# Altium footprint library Connector_Samtec_HLE_SMD.PcbLib: 290 footprints (part 24 of 24)
Each footprint in its own frame and in the unit in brackets; x right, y up, seen from the top. Pads: shape width x height; smd on the part's side, far side on the other; paste and mask are expansions set on the pad; w line width, h text height; cw(c..) or ccw(c..) is an arc to the next point about the centre after c.
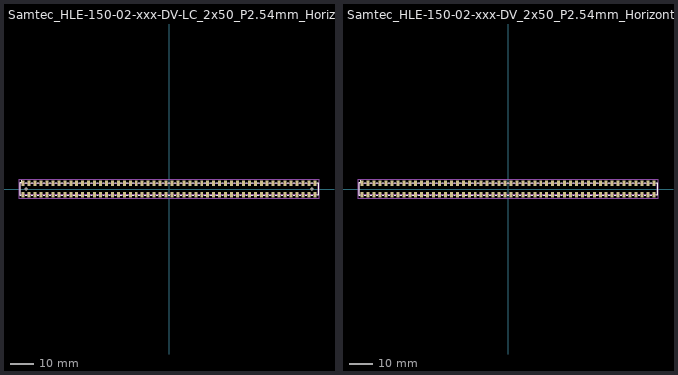
[diagram p23: the footprints below, top view; thin cyan lines are the x and y axes]

## Samtec_HLE-150-02-xxx-DV-LC_2x50_P2.54mm_Horizontal [mm]
pads (102):
  rect 1.27x2.29 smd: 1(-62.23,2.525) 2(-62.23,-2.525) 3(-59.69,2.525) 4(-59.69,-2.525) 5(-57.15,2.525) 6(-57.15,-2.525) 7(-54.61,2.525) 8(-54.61,-2.525) 9(-52.07,2.525) 10(-52.07,-2.525) 11(-49.53,2.525) 12(-49.53,-2.525) 13(-46.99,2.525) 14(-46.99,-2.525) 15(-44.45,2.525) 16(-44.45,-2.525) 17(-41.91,2.525) 18(-41.91,-2.525) 19(-39.37,2.525) 20(-39.37,-2.525) 21(-36.83,2.525) 22(-36.83,-2.525) 23(-34.29,2.525) 24(-34.29,-2.525) 25(-31.75,2.525) 26(-31.75,-2.525) 27(-29.21,2.525) 28(-29.21,-2.525) 29(-26.67,2.525) 30(-26.67,-2.525) 31(-24.13,2.525) 32(-24.13,-2.525) 33(-21.59,2.525) 34(-21.59,-2.525) 35(-19.05,2.525) 36(-19.05,-2.525) 37(-16.51,2.525) 38(-16.51,-2.525) 39(-13.97,2.525) 40(-13.97,-2.525) 41(-11.43,2.525) 42(-11.43,-2.525) 43(-8.89,2.525) 44(-8.89,-2.525) 45(-6.35,2.525) 46(-6.35,-2.525) 47(-3.81,2.525) 48(-3.81,-2.525) 49(-1.27,2.525) 50(-1.27,-2.525) 51(1.27,2.525) 52(1.27,-2.525) 53(3.81,2.525) 54(3.81,-2.525) 55(6.35,2.525) 56(6.35,-2.525) 57(8.89,2.525) 58(8.89,-2.525) 59(11.43,2.525) 60(11.43,-2.525) 61(13.97,2.525) 62(13.97,-2.525) 63(16.51,2.525) 64(16.51,-2.525) 65(19.05,2.525) 66(19.05,-2.525) 67(21.59,2.525) 68(21.59,-2.525) 69(24.13,2.525) 70(24.13,-2.525) 71(26.67,2.525) 72(26.67,-2.525) 73(29.21,2.525) 74(29.21,-2.525) 75(31.75,2.525) 76(31.75,-2.525) 77(34.29,2.525) 78(34.29,-2.525) 79(36.83,2.525) 80(36.83,-2.525) 81(39.37,2.525) 82(39.37,-2.525) 83(41.91,2.525) 84(41.91,-2.525) 85(44.45,2.525) 86(44.45,-2.525) 87(46.99,2.525) 88(46.99,-2.525) 89(49.53,2.525) 90(49.53,-2.525) 91(52.07,2.525) 92(52.07,-2.525) 93(54.61,2.525) 94(54.61,-2.525) 95(57.15,2.525) 96(57.15,-2.525) 97(59.69,2.525) 98(59.69,-2.525) 99(62.23,2.525) 100(62.23,-2.525)
  round 1.19 hole 1.19: Un1(-60.96,0) Un2(60.96,0)
F.SilkS:
  lines w0.12: -63.125,-2.65 -63.61,-2.65 -63.61,2.65 -63.125,2.65 -63.125,3.67 ; -61.335,-2.65 -60.585,-2.65 ; -61.335,2.65 -60.585,2.65 ; -58.795,-2.65 -58.045,-2.65 ; -58.795,2.65 -58.045,2.65 ; -56.255,-2.65 -55.505,-2.65 ; -56.255,2.65 -55.505,2.65 ; -53.715,-2.65 -52.965,-2.65 ; -53.715,2.65 -52.965,2.65 ; -51.175,-2.65 -50.425,-2.65 ; -51.175,2.65 -50.425,2.65 ; -48.635,-2.65 -47.885,-2.65 ; -48.635,2.65 -47.885,2.65 ; -46.095,-2.65 -45.345,-2.65 ; -46.095,2.65 -45.345,2.65 ; -43.555,-2.65 -42.805,-2.65 ; -43.555,2.65 -42.805,2.65 ; -41.015,-2.65 -40.265,-2.65 ; -41.015,2.65 -40.265,2.65 ; -38.475,-2.65 -37.725,-2.65 ; -38.475,2.65 -37.725,2.65 ; -35.935,-2.65 -35.185,-2.65 ; -35.935,2.65 -35.185,2.65 ; -33.395,-2.65 -32.645,-2.65 ; -33.395,2.65 -32.645,2.65 ; -30.855,-2.65 -30.105,-2.65 ; -30.855,2.65 -30.105,2.65 ; -28.315,-2.65 -27.565,-2.65 ; -28.315,2.65 -27.565,2.65 ; -25.775,-2.65 -25.025,-2.65 ; -25.775,2.65 -25.025,2.65 ; -23.235,-2.65 -22.485,-2.65 ; -23.235,2.65 -22.485,2.65 ; -20.695,-2.65 -19.945,-2.65 ; -20.695,2.65 -19.945,2.65 ; -18.155,-2.65 -17.405,-2.65 ; -18.155,2.65 -17.405,2.65 ; -15.615,-2.65 -14.865,-2.65 ; -15.615,2.65 -14.865,2.65 ; -13.075,-2.65 -12.325,-2.65 ; -13.075,2.65 -12.325,2.65 ; -10.535,-2.65 -9.785,-2.65 ; -10.535,2.65 -9.785,2.65 ; -7.995,-2.65 -7.245,-2.65 ; -7.995,2.65 -7.245,2.65 ; -5.455,-2.65 -4.705,-2.65 ; -5.455,2.65 -4.705,2.65 ; -2.915,-2.65 -2.165,-2.65 ; -2.915,2.65 -2.165,2.65 ; -0.375,-2.65 0.375,-2.65 ; -0.375,2.65 0.375,2.65 ; 2.165,-2.65 2.915,-2.65 ; 2.165,2.65 2.915,2.65 ; 4.705,-2.65 5.455,-2.65 ; 4.705,2.65 5.455,2.65 ; 7.245,-2.65 7.995,-2.65 ; 7.245,2.65 7.995,2.65 ; 9.785,-2.65 10.535,-2.65 ; 9.785,2.65 10.535,2.65 ; 12.325,-2.65 13.075,-2.65 ; 12.325,2.65 13.075,2.65 ; 14.865,-2.65 15.615,-2.65 ; 14.865,2.65 15.615,2.65 ; 17.405,-2.65 18.155,-2.65 ; 17.405,2.65 18.155,2.65 ; 19.945,-2.65 20.695,-2.65 ; 19.945,2.65 20.695,2.65 ; 22.485,-2.65 23.235,-2.65 ; 22.485,2.65 23.235,2.65 ; 25.025,-2.65 25.775,-2.65 ; 25.025,2.65 25.775,2.65 ; 27.565,-2.65 28.315,-2.65 ; 27.565,2.65 28.315,2.65 ; 30.105,-2.65 30.855,-2.65 ; 30.105,2.65 30.855,2.65 ; 32.645,-2.65 33.395,-2.65 ; 32.645,2.65 33.395,2.65 ; 35.185,-2.65 35.935,-2.65 ; 35.185,2.65 35.935,2.65 ; 37.725,-2.65 38.475,-2.65 ; 37.725,2.65 38.475,2.65 ; 40.265,-2.65 41.015,-2.65 ; 40.265,2.65 41.015,2.65 ; 42.805,-2.65 43.555,-2.65 ; 42.805,2.65 43.555,2.65 ; 45.345,-2.65 46.095,-2.65 ; 45.345,2.65 46.095,2.65 ; 47.885,-2.65 48.635,-2.65 ; 47.885,2.65 48.635,2.65 ; 50.425,-2.65 51.175,-2.65 ; 50.425,2.65 51.175,2.65 ; 52.965,-2.65 53.715,-2.65 ; 52.965,2.65 53.715,2.65 ; 55.505,-2.65 56.255,-2.65 ; 55.505,2.65 56.255,2.65 ; 58.045,-2.65 58.795,-2.65 ; 58.045,2.65 58.795,2.65 ; 60.585,-2.65 61.335,-2.65 ; 60.585,2.65 61.335,2.65 ; 63.125,-2.65 63.61,-2.65 63.61,2.65 63.125,2.65
F.CrtYd:
  lines w0.05: -64,-4.17 -64,4.17 64,4.17 64,-4.17 -64,-4.17
F.Fab:
  lines w0.1: -62.73,2.54 -62.23,1.833 -61.73,2.54 ; -63.5,-2.54 -63.5,2.54 63.5,2.54 63.5,-2.54 -63.5,-2.54
  text "'.Designator'" at -4.047,-2.68 h1

## Samtec_HLE-150-02-xxx-DV_2x50_P2.54mm_Horizontal [mm]
pads (100):
  rect 1.27x2.29 smd: 1(-62.23,2.525) 2(-62.23,-2.525) 3(-59.69,2.525) 4(-59.69,-2.525) 5(-57.15,2.525) 6(-57.15,-2.525) 7(-54.61,2.525) 8(-54.61,-2.525) 9(-52.07,2.525) 10(-52.07,-2.525) 11(-49.53,2.525) 12(-49.53,-2.525) 13(-46.99,2.525) 14(-46.99,-2.525) 15(-44.45,2.525) 16(-44.45,-2.525) 17(-41.91,2.525) 18(-41.91,-2.525) 19(-39.37,2.525) 20(-39.37,-2.525) 21(-36.83,2.525) 22(-36.83,-2.525) 23(-34.29,2.525) 24(-34.29,-2.525) 25(-31.75,2.525) 26(-31.75,-2.525) 27(-29.21,2.525) 28(-29.21,-2.525) 29(-26.67,2.525) 30(-26.67,-2.525) 31(-24.13,2.525) 32(-24.13,-2.525) 33(-21.59,2.525) 34(-21.59,-2.525) 35(-19.05,2.525) 36(-19.05,-2.525) 37(-16.51,2.525) 38(-16.51,-2.525) 39(-13.97,2.525) 40(-13.97,-2.525) 41(-11.43,2.525) 42(-11.43,-2.525) 43(-8.89,2.525) 44(-8.89,-2.525) 45(-6.35,2.525) 46(-6.35,-2.525) 47(-3.81,2.525) 48(-3.81,-2.525) 49(-1.27,2.525) 50(-1.27,-2.525) 51(1.27,2.525) 52(1.27,-2.525) 53(3.81,2.525) 54(3.81,-2.525) 55(6.35,2.525) 56(6.35,-2.525) 57(8.89,2.525) 58(8.89,-2.525) 59(11.43,2.525) 60(11.43,-2.525) 61(13.97,2.525) 62(13.97,-2.525) 63(16.51,2.525) 64(16.51,-2.525) 65(19.05,2.525) 66(19.05,-2.525) 67(21.59,2.525) 68(21.59,-2.525) 69(24.13,2.525) 70(24.13,-2.525) 71(26.67,2.525) 72(26.67,-2.525) 73(29.21,2.525) 74(29.21,-2.525) 75(31.75,2.525) 76(31.75,-2.525) 77(34.29,2.525) 78(34.29,-2.525) 79(36.83,2.525) 80(36.83,-2.525) 81(39.37,2.525) 82(39.37,-2.525) 83(41.91,2.525) 84(41.91,-2.525) 85(44.45,2.525) 86(44.45,-2.525) 87(46.99,2.525) 88(46.99,-2.525) 89(49.53,2.525) 90(49.53,-2.525) 91(52.07,2.525) 92(52.07,-2.525) 93(54.61,2.525) 94(54.61,-2.525) 95(57.15,2.525) 96(57.15,-2.525) 97(59.69,2.525) 98(59.69,-2.525) 99(62.23,2.525) 100(62.23,-2.525)
F.SilkS:
  lines w0.12: -63.125,-2.65 -63.61,-2.65 -63.61,2.65 -63.125,2.65 -63.125,3.67 ; -61.335,-2.65 -60.585,-2.65 ; -61.335,2.65 -60.585,2.65 ; -58.795,-2.65 -58.045,-2.65 ; -58.795,2.65 -58.045,2.65 ; -56.255,-2.65 -55.505,-2.65 ; -56.255,2.65 -55.505,2.65 ; -53.715,-2.65 -52.965,-2.65 ; -53.715,2.65 -52.965,2.65 ; -51.175,-2.65 -50.425,-2.65 ; -51.175,2.65 -50.425,2.65 ; -48.635,-2.65 -47.885,-2.65 ; -48.635,2.65 -47.885,2.65 ; -46.095,-2.65 -45.345,-2.65 ; -46.095,2.65 -45.345,2.65 ; -43.555,-2.65 -42.805,-2.65 ; -43.555,2.65 -42.805,2.65 ; -41.015,-2.65 -40.265,-2.65 ; -41.015,2.65 -40.265,2.65 ; -38.475,-2.65 -37.725,-2.65 ; -38.475,2.65 -37.725,2.65 ; -35.935,-2.65 -35.185,-2.65 ; -35.935,2.65 -35.185,2.65 ; -33.395,-2.65 -32.645,-2.65 ; -33.395,2.65 -32.645,2.65 ; -30.855,-2.65 -30.105,-2.65 ; -30.855,2.65 -30.105,2.65 ; -28.315,-2.65 -27.565,-2.65 ; -28.315,2.65 -27.565,2.65 ; -25.775,-2.65 -25.025,-2.65 ; -25.775,2.65 -25.025,2.65 ; -23.235,-2.65 -22.485,-2.65 ; -23.235,2.65 -22.485,2.65 ; -20.695,-2.65 -19.945,-2.65 ; -20.695,2.65 -19.945,2.65 ; -18.155,-2.65 -17.405,-2.65 ; -18.155,2.65 -17.405,2.65 ; -15.615,-2.65 -14.865,-2.65 ; -15.615,2.65 -14.865,2.65 ; -13.075,-2.65 -12.325,-2.65 ; -13.075,2.65 -12.325,2.65 ; -10.535,-2.65 -9.785,-2.65 ; -10.535,2.65 -9.785,2.65 ; -7.995,-2.65 -7.245,-2.65 ; -7.995,2.65 -7.245,2.65 ; -5.455,-2.65 -4.705,-2.65 ; -5.455,2.65 -4.705,2.65 ; -2.915,-2.65 -2.165,-2.65 ; -2.915,2.65 -2.165,2.65 ; -0.375,-2.65 0.375,-2.65 ; -0.375,2.65 0.375,2.65 ; 2.165,-2.65 2.915,-2.65 ; 2.165,2.65 2.915,2.65 ; 4.705,-2.65 5.455,-2.65 ; 4.705,2.65 5.455,2.65 ; 7.245,-2.65 7.995,-2.65 ; 7.245,2.65 7.995,2.65 ; 9.785,-2.65 10.535,-2.65 ; 9.785,2.65 10.535,2.65 ; 12.325,-2.65 13.075,-2.65 ; 12.325,2.65 13.075,2.65 ; 14.865,-2.65 15.615,-2.65 ; 14.865,2.65 15.615,2.65 ; 17.405,-2.65 18.155,-2.65 ; 17.405,2.65 18.155,2.65 ; 19.945,-2.65 20.695,-2.65 ; 19.945,2.65 20.695,2.65 ; 22.485,-2.65 23.235,-2.65 ; 22.485,2.65 23.235,2.65 ; 25.025,-2.65 25.775,-2.65 ; 25.025,2.65 25.775,2.65 ; 27.565,-2.65 28.315,-2.65 ; 27.565,2.65 28.315,2.65 ; 30.105,-2.65 30.855,-2.65 ; 30.105,2.65 30.855,2.65 ; 32.645,-2.65 33.395,-2.65 ; 32.645,2.65 33.395,2.65 ; 35.185,-2.65 35.935,-2.65 ; 35.185,2.65 35.935,2.65 ; 37.725,-2.65 38.475,-2.65 ; 37.725,2.65 38.475,2.65 ; 40.265,-2.65 41.015,-2.65 ; 40.265,2.65 41.015,2.65 ; 42.805,-2.65 43.555,-2.65 ; 42.805,2.65 43.555,2.65 ; 45.345,-2.65 46.095,-2.65 ; 45.345,2.65 46.095,2.65 ; 47.885,-2.65 48.635,-2.65 ; 47.885,2.65 48.635,2.65 ; 50.425,-2.65 51.175,-2.65 ; 50.425,2.65 51.175,2.65 ; 52.965,-2.65 53.715,-2.65 ; 52.965,2.65 53.715,2.65 ; 55.505,-2.65 56.255,-2.65 ; 55.505,2.65 56.255,2.65 ; 58.045,-2.65 58.795,-2.65 ; 58.045,2.65 58.795,2.65 ; 60.585,-2.65 61.335,-2.65 ; 60.585,2.65 61.335,2.65 ; 63.125,-2.65 63.61,-2.65 63.61,2.65 63.125,2.65
F.CrtYd:
  lines w0.05: -64,-4.17 64,-4.17 64,4.17 -64,4.17 -64,-4.17
F.Fab:
  lines w0.1: -62.73,2.54 -62.23,1.833 -61.73,2.54 ; -63.5,-2.54 -63.5,2.54 63.5,2.54 63.5,-2.54 -63.5,-2.54
  text "'.Designator'" at -4.047,-2.68 h1